# Altium footprint library con-samtec.PCBLIB: 805 footprints (part 44 of 55) (continued)
## TSW-136-02-S-Q-RA [mil]
pads (72):
  oct 59.06x59.06 hole 39.37: 1(1750,60) 2(1750,260) 3(1650,60) 4(1650,260) 5(1550,60) 6(1550,260) 7(1450,60) 8(1450,260) 9(1350,60) 10(1350,260) 11(1250,60) 12(1250,260) 13(1150,60) 14(1150,260) 15(1050,60) 16(1050,260) 17(950,60) 18(950,260) 19(850,60) 20(850,260) 21(750,60) 22(750,260) 23(650,60) 24(650,260) 25(550,60) 26(550,260) 27(450,60) 28(450,260) 29(350,60) 30(350,260) 31(250,60) 32(250,260) 33(150,60) 34(150,260) 35(50,60) 36(50,260) 37(-50,60) 38(-50,260) 39(-150,60) 40(-150,260) 41(-250,60) 42(-250,260) 43(-350,60) 44(-350,260) 45(-450,60) 46(-450,260) 47(-550,60) 48(-550,260) 49(-650,60) 50(-650,260) 51(-750,60) 52(-750,260) 53(-850,60) 54(-850,260) 55(-950,60) 56(-950,260) 57(-1050,60) 58(-1050,260) 59(-1150,60) 60(-1150,260) 61(-1250,60) 62(-1250,260) 63(-1350,60) 64(-1350,260) 65(-1450,60) 66(-1450,260) 67(-1550,60) 68(-1550,260) 69(-1650,60) 70(-1650,260) 71(-1750,60) 72(-1750,260)
Top Overlay:
  rectangle: -1760,-310.63 -1740,-80.32
  rectangle: -1660,-310.63 -1640,-80.32
  rectangle: -1560,-310.63 -1540,-80.32
  rectangle: -1460,-310.63 -1440,-80.32
  rectangle: -1360,-310.63 -1340,-80.32
  rectangle: -1260,-310.63 -1240,-80.32
  rectangle: -1160,-310.63 -1140,-80.32
  rectangle: -1060,-310.63 -1040,-80.32
  rectangle: -960,-310.63 -940,-80.32
  rectangle: -860,-310.63 -840,-80.32
  rectangle: -760,-310.63 -740,-80.32
  rectangle: -660,-310.63 -640,-80.32
  rectangle: -560,-310.63 -540,-80.32
  rectangle: -460,-310.63 -440,-80.32
  rectangle: -360,-310.63 -340,-80.32
  rectangle: -260,-310.63 -240,-80.32
  rectangle: -160,-310.63 -140,-80.32
  rectangle: -60,-310.63 -40,-80.32
  rectangle: 40,-310.63 60,-80.32
  rectangle: 140,-310.63 160,-80.32
  rectangle: 240,-310.63 260,-80.32
  rectangle: 340,-310.63 360,-80.32
  rectangle: 440,-310.63 460,-80.32
  rectangle: 540,-310.63 560,-80.32
  rectangle: 640,-310.63 660,-80.32
  rectangle: 740,-310.63 760,-80.32
  rectangle: 840,-310.63 860,-80.32
  rectangle: 940,-310.63 960,-80.32
  rectangle: 1040,-310.63 1060,-80.32
  rectangle: 1140,-310.63 1160,-80.32
  rectangle: 1240,-310.63 1260,-80.32
  rectangle: 1340,-310.63 1360,-80.32
  rectangle: 1440,-310.63 1460,-80.32
  rectangle: 1540,-310.63 1560,-80.32
  rectangle: 1640,-310.63 1660,-80.32
  rectangle: 1740,-310.63 1760,-80.32
  lines w8: -1805.08,-80.55 1805.08,-80.55 1805.08,-4.17 -1805.08,-4.17 -1805.08,-80.55
  text "1" at 1803.54,43.31 h36.81
  text "2" at 1801.18,242.72 h36.81
Mechanical 16:
  rectangle: -1760,0 -1740,270
  rectangle: -1660,0 -1640,270
  rectangle: -1560,0 -1540,270
  rectangle: -1460,0 -1440,270
  rectangle: -1360,0 -1340,270
  rectangle: -1260,0 -1240,270
  rectangle: -1160,0 -1140,270
  rectangle: -1060,0 -1040,270
  rectangle: -960,0 -940,270
  rectangle: -860,0 -840,270
  rectangle: -760,0 -740,270
  rectangle: -660,0 -640,270
  rectangle: -560,0 -540,270
  rectangle: -460,0 -440,270
  rectangle: -360,0 -340,270
  rectangle: -260,0 -240,270
  rectangle: -160,0 -140,270
  rectangle: -60,0 -40,270
  rectangle: 40,0 60,270
  rectangle: 140,0 160,270
  rectangle: 240,0 260,270
  rectangle: 340,0 360,270
  rectangle: 440,0 460,270
  rectangle: 540,0 560,270
  rectangle: 640,0 660,270
  rectangle: 740,0 760,270
  rectangle: 840,0 860,270
  rectangle: 940,0 960,270
  rectangle: 1040,0 1060,270
  rectangle: 1140,0 1160,270
  rectangle: 1240,0 1260,270
  rectangle: 1340,0 1360,270
  rectangle: 1440,0 1460,270
  rectangle: 1540,0 1560,270
  rectangle: 1640,0 1660,270
  rectangle: 1740,0 1760,270

## TSW-136-02-S-S [mm]
pads (36):
  oct 1.5x1.5 hole 1: 1(44.45,0) 2(41.91,0) 3(39.37,0) 4(36.83,0) 5(34.29,0) 6(31.75,0) 7(29.21,0) 8(26.67,0) 9(24.13,0) 10(21.59,0) 11(19.05,0) 12(16.51,0) 13(13.97,0) 14(11.43,0) 15(8.89,0) 16(6.35,0) 17(3.81,0) 18(1.27,0) 19(-1.27,0) 20(-3.81,0) 21(-6.35,0) 22(-8.89,0) 23(-11.43,0) 24(-13.97,0) 25(-16.51,0) 26(-19.05,0) 27(-21.59,0) 28(-24.13,0) 29(-26.67,0) 30(-29.21,0) 31(-31.75,0) 32(-34.29,0) 33(-36.83,0) 34(-39.37,0) 35(-41.91,0) 36(-44.45,0)
Top Overlay:
  lines w0.203: -45.849,-1.155 45.849,-1.155 45.849,1.155 -45.849,1.155 -45.849,-1.155
  text "1" at 44.192,-2.498 h0.94
Mechanical 16:
  rectangle: -44.8,-0.35 -44.1,0.35
  rectangle: -42.26,-0.35 -41.56,0.35
  rectangle: -39.72,-0.35 -39.02,0.35
  rectangle: -37.18,-0.35 -36.48,0.35
  rectangle: -34.64,-0.35 -33.94,0.35
  rectangle: -32.1,-0.35 -31.4,0.35
  rectangle: -29.56,-0.35 -28.86,0.35
  rectangle: -27.02,-0.35 -26.32,0.35
  rectangle: -24.48,-0.35 -23.78,0.35
  rectangle: -21.94,-0.35 -21.24,0.35
  rectangle: -19.4,-0.35 -18.7,0.35
  rectangle: -16.86,-0.35 -16.16,0.35
  rectangle: -14.32,-0.35 -13.62,0.35
  rectangle: -11.78,-0.35 -11.08,0.35
  rectangle: -9.24,-0.35 -8.54,0.35
  rectangle: -6.7,-0.35 -6,0.35
  rectangle: -4.16,-0.35 -3.46,0.35
  rectangle: -1.62,-0.35 -0.92,0.35
  rectangle: 0.92,-0.35 1.62,0.35
  rectangle: 3.46,-0.35 4.16,0.35
  rectangle: 6,-0.35 6.7,0.35
  rectangle: 8.54,-0.35 9.24,0.35
  rectangle: 11.08,-0.35 11.78,0.35
  rectangle: 13.62,-0.35 14.32,0.35
  rectangle: 16.16,-0.35 16.86,0.35
  rectangle: 18.7,-0.35 19.4,0.35
  rectangle: 21.24,-0.35 21.94,0.35
  rectangle: 23.78,-0.35 24.48,0.35
  rectangle: 26.32,-0.35 27.02,0.35
  rectangle: 28.86,-0.35 29.56,0.35
  rectangle: 31.4,-0.35 32.1,0.35
  rectangle: 33.94,-0.35 34.64,0.35
  rectangle: 36.48,-0.35 37.18,0.35
  rectangle: 39.02,-0.35 39.72,0.35
  rectangle: 41.56,-0.35 42.26,0.35
  rectangle: 44.1,-0.35 44.8,0.35

## TSW-136-02-S-S-RA [mil]
pads (36):
  oct 59.06x59.06 hole 39.37: 1(1750,60) 2(1650,60) 3(1550,60) 4(1450,60) 5(1350,60) 6(1250,60) 7(1150,60) 8(1050,60) 9(950,60) 10(850,60) 11(750,60) 12(650,60) 13(550,60) 14(450,60) 15(350,60) 16(250,60) 17(150,60) 18(50,60) 19(-50,60) 20(-150,60) 21(-250,60) 22(-350,60) 23(-450,60) 24(-550,60) 25(-650,60) 26(-750,60) 27(-850,60) 28(-950,60) 29(-1050,60) 30(-1150,60) 31(-1250,60) 32(-1350,60) 33(-1450,60) 34(-1550,60) 35(-1650,60) 36(-1750,60)
Top Overlay:
  rectangle: -1760,-310.63 -1740,-80.32
  rectangle: -1660,-310.63 -1640,-80.32
  rectangle: -1560,-310.63 -1540,-80.32
  rectangle: -1460,-310.63 -1440,-80.32
  rectangle: -1360,-310.63 -1340,-80.32
  rectangle: -1260,-310.63 -1240,-80.32
  rectangle: -1160,-310.63 -1140,-80.32
  rectangle: -1060,-310.63 -1040,-80.32
  rectangle: -960,-310.63 -940,-80.32
  rectangle: -860,-310.63 -840,-80.32
  rectangle: -760,-310.63 -740,-80.32
  rectangle: -660,-310.63 -640,-80.32
  rectangle: -560,-310.63 -540,-80.32
  rectangle: -460,-310.63 -440,-80.32
  rectangle: -360,-310.63 -340,-80.32
  rectangle: -260,-310.63 -240,-80.32
  rectangle: -160,-310.63 -140,-80.32
  rectangle: -60,-310.63 -40,-80.32
  rectangle: 40,-310.63 60,-80.32
  rectangle: 140,-310.63 160,-80.32
  rectangle: 240,-310.63 260,-80.32
  rectangle: 340,-310.63 360,-80.32
  rectangle: 440,-310.63 460,-80.32
  rectangle: 540,-310.63 560,-80.32
  rectangle: 640,-310.63 660,-80.32
  rectangle: 740,-310.63 760,-80.32
  rectangle: 840,-310.63 860,-80.32
  rectangle: 940,-310.63 960,-80.32
  rectangle: 1040,-310.63 1060,-80.32
  rectangle: 1140,-310.63 1160,-80.32
  rectangle: 1240,-310.63 1260,-80.32
  rectangle: 1340,-310.63 1360,-80.32
  rectangle: 1440,-310.63 1460,-80.32
  rectangle: 1540,-310.63 1560,-80.32
  rectangle: 1640,-310.63 1660,-80.32
  rectangle: 1740,-310.63 1760,-80.32
  lines w8: -1805.08,-80.55 1805.08,-80.55 1805.08,-4.17 -1805.08,-4.17 -1805.08,-80.55
  text "1" at 1800.47,45.35 h36.81
Mechanical 16:
  rectangle: -1760,0 -1740,70
  rectangle: -1660,0 -1640,70
  rectangle: -1560,0 -1540,70
  rectangle: -1460,0 -1440,70
  rectangle: -1360,0 -1340,70
  rectangle: -1260,0 -1240,70
  rectangle: -1160,0 -1140,70
  rectangle: -1060,0 -1040,70
  rectangle: -960,0 -940,70
  rectangle: -860,0 -840,70
  rectangle: -760,0 -740,70
  rectangle: -660,0 -640,70
  rectangle: -560,0 -540,70
  rectangle: -460,0 -440,70
  rectangle: -360,0 -340,70
  rectangle: -260,0 -240,70
  rectangle: -160,0 -140,70
  rectangle: -60,0 -40,70
  rectangle: 40,0 60,70
  rectangle: 140,0 160,70
  rectangle: 240,0 260,70
  rectangle: 340,0 360,70
  rectangle: 440,0 460,70
  rectangle: 540,0 560,70
  rectangle: 640,0 660,70
  rectangle: 740,0 760,70
  rectangle: 840,0 860,70
  rectangle: 940,0 960,70
  rectangle: 1040,0 1060,70
  rectangle: 1140,0 1160,70
  rectangle: 1240,0 1260,70
  rectangle: 1340,0 1360,70
  rectangle: 1440,0 1460,70
  rectangle: 1540,0 1560,70
  rectangle: 1640,0 1660,70
  rectangle: 1740,0 1760,70

## TSW-136-02-S-T [mm]
pads (108):
  oct 1.5x1.5 hole 1: 1(44.45,-2.54) 2(44.45,0) 3(44.45,2.54) 4(41.91,-2.54) 5(41.91,0) 6(41.91,2.54) 7(39.37,-2.54) 8(39.37,0) 9(39.37,2.54) 10(36.83,-2.54) 11(36.83,0) 12(36.83,2.54) 13(34.29,-2.54) 14(34.29,0) 15(34.29,2.54) 16(31.75,-2.54) 17(31.75,0) 18(31.75,2.54) 19(29.21,-2.54) 20(29.21,0) 21(29.21,2.54) 22(26.67,-2.54) 23(26.67,0) 24(26.67,2.54) 25(24.13,-2.54) 26(24.13,0) 27(24.13,2.54) 28(21.59,-2.54) 29(21.59,0) 30(21.59,2.54) 31(19.05,-2.54) 32(19.05,0) 33(19.05,2.54) 34(16.51,-2.54) 35(16.51,0) 36(16.51,2.54) 37(13.97,-2.54) 38(13.97,0) 39(13.97,2.54) 40(11.43,-2.54) 41(11.43,0) 42(11.43,2.54) 43(8.89,-2.54) 44(8.89,0) 45(8.89,2.54) 46(6.35,-2.54) 47(6.35,0) 48(6.35,2.54) 49(3.81,-2.54) 50(3.81,0) 51(3.81,2.54) 52(1.27,-2.54) 53(1.27,0) 54(1.27,2.54) 55(-1.27,-2.54) 56(-1.27,0) 57(-1.27,2.54) 58(-3.81,-2.54) 59(-3.81,0) 60(-3.81,2.54) 61(-6.35,-2.54) 62(-6.35,0) 63(-6.35,2.54) 64(-8.89,-2.54) 65(-8.89,0) 66(-8.89,2.54) 67(-11.43,-2.54) 68(-11.43,0) 69(-11.43,2.54) 70(-13.97,-2.54) 71(-13.97,0) 72(-13.97,2.54) 73(-16.51,-2.54) 74(-16.51,0) 75(-16.51,2.54) 76(-19.05,-2.54) 77(-19.05,0) 78(-19.05,2.54) 79(-21.59,-2.54) 80(-21.59,0) 81(-21.59,2.54) 82(-24.13,-2.54) 83(-24.13,0) 84(-24.13,2.54) 85(-26.67,-2.54) 86(-26.67,0) 87(-26.67,2.54) 88(-29.21,-2.54) 89(-29.21,0) 90(-29.21,2.54) 91(-31.75,-2.54) 92(-31.75,0) 93(-31.75,2.54) 94(-34.29,-2.54) 95(-34.29,0) 96(-34.29,2.54) 97(-36.83,-2.54) 98(-36.83,0) 99(-36.83,2.54) 100(-39.37,-2.54) 101(-39.37,0) 102(-39.37,2.54) 103(-41.91,-2.54) 104(-41.91,0) 105(-41.91,2.54) 106(-44.45,-2.54) 107(-44.45,0) 108(-44.45,2.54)
Top Overlay:
  lines w0.203: -45.849,-3.695 45.849,-3.695 45.849,3.695 -45.849,3.695 -45.849,-3.695
  text "1" at 44.142,-5.188 h0.94
  text "3" at 44.138,3.989 h0.94
Mechanical 16:
  rectangle: -44.8,-2.89 -44.1,-2.19
  rectangle: -44.8,-0.35 -44.1,0.35
  rectangle: -44.8,2.19 -44.1,2.89
  rectangle: -42.26,-2.89 -41.56,-2.19
  rectangle: -42.26,-0.35 -41.56,0.35
  rectangle: -42.26,2.19 -41.56,2.89
  rectangle: -39.72,-2.89 -39.02,-2.19
  rectangle: -39.72,-0.35 -39.02,0.35
  rectangle: -39.72,2.19 -39.02,2.89
  rectangle: -37.18,-2.89 -36.48,-2.19
  rectangle: -37.18,-0.35 -36.48,0.35
  rectangle: -37.18,2.19 -36.48,2.89
  rectangle: -34.64,-2.89 -33.94,-2.19
  rectangle: -34.64,-0.35 -33.94,0.35
  rectangle: -34.64,2.19 -33.94,2.89
  rectangle: -32.1,-2.89 -31.4,-2.19
  rectangle: -32.1,-0.35 -31.4,0.35
  rectangle: -32.1,2.19 -31.4,2.89
  rectangle: -29.56,-2.89 -28.86,-2.19
  rectangle: -29.56,-0.35 -28.86,0.35
  rectangle: -29.56,2.19 -28.86,2.89
  rectangle: -27.02,-2.89 -26.32,-2.19
  rectangle: -27.02,-0.35 -26.32,0.35
  rectangle: -27.02,2.19 -26.32,2.89
  rectangle: -24.48,-2.89 -23.78,-2.19
  rectangle: -24.48,-0.35 -23.78,0.35
  rectangle: -24.48,2.19 -23.78,2.89
  rectangle: -21.94,-2.89 -21.24,-2.19
  rectangle: -21.94,-0.35 -21.24,0.35
  rectangle: -21.94,2.19 -21.24,2.89
  rectangle: -19.4,-2.89 -18.7,-2.19
  rectangle: -19.4,-0.35 -18.7,0.35
  rectangle: -19.4,2.19 -18.7,2.89
  rectangle: -16.86,-2.89 -16.16,-2.19
  rectangle: -16.86,-0.35 -16.16,0.35
  rectangle: -16.86,2.19 -16.16,2.89
  rectangle: -14.32,-2.89 -13.62,-2.19
  rectangle: -14.32,-0.35 -13.62,0.35
  rectangle: -14.32,2.19 -13.62,2.89
  rectangle: -11.78,-2.89 -11.08,-2.19
  rectangle: -11.78,-0.35 -11.08,0.35
  rectangle: -11.78,2.19 -11.08,2.89
  rectangle: -9.24,-2.89 -8.54,-2.19
  rectangle: -9.24,-0.35 -8.54,0.35
  rectangle: -9.24,2.19 -8.54,2.89
  rectangle: -6.7,-2.89 -6,-2.19
  rectangle: -6.7,-0.35 -6,0.35
  rectangle: -6.7,2.19 -6,2.89
  rectangle: -4.16,-2.89 -3.46,-2.19
  rectangle: -4.16,-0.35 -3.46,0.35
  rectangle: -4.16,2.19 -3.46,2.89
  rectangle: -1.62,-2.89 -0.92,-2.19
  rectangle: -1.62,-0.35 -0.92,0.35
  rectangle: -1.62,2.19 -0.92,2.89
  rectangle: 0.92,-2.89 1.62,-2.19
  rectangle: 0.92,-0.35 1.62,0.35
  rectangle: 0.92,2.19 1.62,2.89
  rectangle: 3.46,-2.89 4.16,-2.19
  rectangle: 3.46,-0.35 4.16,0.35
  rectangle: 3.46,2.19 4.16,2.89
  rectangle: 6,-2.89 6.7,-2.19
  rectangle: 6,-0.35 6.7,0.35
  rectangle: 6,2.19 6.7,2.89
  rectangle: 8.54,-2.89 9.24,-2.19
  rectangle: 8.54,-0.35 9.24,0.35
  rectangle: 8.54,2.19 9.24,2.89
  rectangle: 11.08,-2.89 11.78,-2.19
  rectangle: 11.08,-0.35 11.78,0.35
  rectangle: 11.08,2.19 11.78,2.89
  rectangle: 13.62,-2.89 14.32,-2.19
  rectangle: 13.62,-0.35 14.32,0.35
  rectangle: 13.62,2.19 14.32,2.89
  rectangle: 16.16,-2.89 16.86,-2.19
  rectangle: 16.16,-0.35 16.86,0.35
  rectangle: 16.16,2.19 16.86,2.89
  rectangle: 18.7,-2.89 19.4,-2.19
  rectangle: 18.7,-0.35 19.4,0.35
  rectangle: 18.7,2.19 19.4,2.89
  rectangle: 21.24,-2.89 21.94,-2.19
  rectangle: 21.24,-0.35 21.94,0.35
  rectangle: 21.24,2.19 21.94,2.89
  rectangle: 23.78,-2.89 24.48,-2.19
  rectangle: 23.78,-0.35 24.48,0.35
  rectangle: 23.78,2.19 24.48,2.89
  rectangle: 26.32,-2.89 27.02,-2.19
  rectangle: 26.32,-0.35 27.02,0.35
  rectangle: 26.32,2.19 27.02,2.89
  rectangle: 28.86,-2.89 29.56,-2.19
  rectangle: 28.86,-0.35 29.56,0.35
  rectangle: 28.86,2.19 29.56,2.89
  rectangle: 31.4,-2.89 32.1,-2.19
  rectangle: 31.4,-0.35 32.1,0.35
  rectangle: 31.4,2.19 32.1,2.89
  rectangle: 33.94,-2.89 34.64,-2.19
  rectangle: 33.94,-0.35 34.64,0.35
  rectangle: 33.94,2.19 34.64,2.89
  rectangle: 36.48,-2.89 37.18,-2.19
  rectangle: 36.48,-0.35 37.18,0.35
  rectangle: 36.48,2.19 37.18,2.89
  rectangle: 39.02,-2.89 39.72,-2.19
  rectangle: 39.02,-0.35 39.72,0.35
  rectangle: 39.02,2.19 39.72,2.89
  rectangle: 41.56,-2.89 42.26,-2.19
  rectangle: 41.56,-0.35 42.26,0.35
  rectangle: 41.56,2.19 42.26,2.89
  rectangle: 44.1,-2.89 44.8,-2.19
  rectangle: 44.1,-0.35 44.8,0.35
  rectangle: 44.1,2.19 44.8,2.89

## TSW-136-02-S-T-RA [mil]
pads (105):
  oct 59.06x59.06 hole 39.37: 1(1650,60) 2(1650,160) 3(1650,260) 4(1550,60) 5(1550,160) 6(1550,260) 7(1450,60) 8(1450,160) 9(1450,260) 10(1350,60) 11(1350,160) 12(1350,260) 13(1250,60) 14(1250,160) 15(1250,260) 16(1150,60) 17(1150,160) 18(1150,260) 19(1050,60) 20(1050,160) 21(1050,260) 22(950,60) 23(950,160) 24(950,260) 25(850,60) 26(850,160) 27(850,260) 28(750,60) 29(750,160) 30(750,260) 31(650,60) 32(650,160) 33(650,260) 34(550,60) 35(550,160) 36(550,260) 37(450,60) 38(450,160) 39(450,260) 40(350,60) 41(350,160) 42(350,260) 43(250,60) 44(250,160) 45(250,260) 46(150,60) 47(150,160) 48(150,260) 49(50,60) 50(50,160) 51(50,260) 52(-50,60) 53(-50,160) 54(-50,260) 55(-150,60) 56(-150,160) 57(-150,260) 58(-250,60) 59(-250,160) 60(-250,260) 61(-350,60) 62(-350,160) 63(-350,260) 64(-450,60) 65(-450,160) 66(-450,260) 67(-550,60) 68(-550,160) 69(-550,260) 70(-650,60) 71(-650,160) 72(-650,260) 73(-750,60) 74(-750,160) 75(-750,260) 76(-850,60) 77(-850,160) 78(-850,260) 79(-950,60) 80(-950,160) 81(-950,260) 82(-1050,60) 83(-1050,160) 84(-1050,260) 85(-1150,60) 86(-1150,160) 87(-1150,260) 88(-1250,60) 89(-1250,160) 90(-1250,260) 91(-1350,60) 92(-1350,160) 93(-1350,260) 94(-1450,60) 95(-1450,160) 96(-1450,260) 97(-1550,60) 98(-1550,160) 99(-1550,260) 100(-1650,60) 101(-1650,160) 102(-1650,260) 103(-1750,60) 104(-1750,160) 105(-1750,260)
Top Overlay:
  rectangle: -1760,-310.63 -1740,-80.32
  rectangle: -1660,-310.63 -1640,-80.32
  rectangle: -1560,-310.63 -1540,-80.32
  rectangle: -1460,-310.63 -1440,-80.32
  rectangle: -1360,-310.63 -1340,-80.32
  rectangle: -1260,-310.63 -1240,-80.32
  rectangle: -1160,-310.63 -1140,-80.32
  rectangle: -1060,-310.63 -1040,-80.32
  rectangle: -960,-310.63 -940,-80.32
  rectangle: -860,-310.63 -840,-80.32
  rectangle: -760,-310.63 -740,-80.32
  rectangle: -660,-310.63 -640,-80.32
  rectangle: -560,-310.63 -540,-80.32
  rectangle: -460,-310.63 -440,-80.32
  rectangle: -360,-310.63 -340,-80.32
  rectangle: -260,-310.63 -240,-80.32
  rectangle: -160,-310.63 -140,-80.32
  rectangle: -60,-310.63 -40,-80.32
  rectangle: 40,-310.63 60,-80.32
  rectangle: 140,-310.63 160,-80.32
  rectangle: 240,-310.63 260,-80.32
  rectangle: 340,-310.63 360,-80.32
  rectangle: 440,-310.63 460,-80.32
  rectangle: 540,-310.63 560,-80.32
  rectangle: 640,-310.63 660,-80.32
  rectangle: 740,-310.63 760,-80.32
  rectangle: 840,-310.63 860,-80.32
  rectangle: 940,-310.63 960,-80.32
  rectangle: 1040,-310.63 1060,-80.32
  rectangle: 1140,-310.63 1160,-80.32
  rectangle: 1240,-310.63 1260,-80.32
  rectangle: 1340,-310.63 1360,-80.32
  rectangle: 1440,-310.63 1460,-80.32
  rectangle: 1540,-310.63 1560,-80.32
  rectangle: 1640,-310.63 1660,-80.32
  lines w8: -1805.08,-80.55 1705.08,-80.55 1705.08,-4.17 -1805.08,-4.17 -1805.08,-80.55
  text "1" at 1701.57,41.34 h36.81
  text "3" at 1702.17,236.81 h36.81
Mechanical 16:
  rectangle: -1760,0 -1740,270
  rectangle: -1660,0 -1640,270
  rectangle: -1560,0 -1540,270
  rectangle: -1460,0 -1440,270
  rectangle: -1360,0 -1340,270
  rectangle: -1260,0 -1240,270
  rectangle: -1160,0 -1140,270
  rectangle: -1060,0 -1040,270
  rectangle: -960,0 -940,270
  rectangle: -860,0 -840,270
  rectangle: -760,0 -740,270
  rectangle: -660,0 -640,270
  rectangle: -560,0 -540,270
  rectangle: -460,0 -440,270
  rectangle: -360,0 -340,270
  rectangle: -260,0 -240,270
  rectangle: -160,0 -140,270
  rectangle: -60,0 -40,270
  rectangle: 40,0 60,270
  rectangle: 140,0 160,270
  rectangle: 240,0 260,270
  rectangle: 340,0 360,270
  rectangle: 440,0 460,270
  rectangle: 540,0 560,270
  rectangle: 640,0 660,270
  rectangle: 740,0 760,270
  rectangle: 840,0 860,270
  rectangle: 940,0 960,270
  rectangle: 1040,0 1060,270
  rectangle: 1140,0 1160,270
  rectangle: 1240,0 1260,270
  rectangle: 1340,0 1360,270
  rectangle: 1440,0 1460,270
  rectangle: 1540,0 1560,270
  rectangle: 1640,0 1660,270

## TSW-137-02-S-D [mm]
pads (74):
  oct 1.5x1.5 hole 1: 1(45.72,-1.27) 2(45.72,1.27) 3(43.18,-1.27) 4(43.18,1.27) 5(40.64,-1.27) 6(40.64,1.27) 7(38.1,-1.27) 8(38.1,1.27) 9(35.56,-1.27) 10(35.56,1.27) 11(33.02,-1.27) 12(33.02,1.27) 13(30.48,-1.27) 14(30.48,1.27) 15(27.94,-1.27) 16(27.94,1.27) 17(25.4,-1.27) 18(25.4,1.27) 19(22.86,-1.27) 20(22.86,1.27) 21(20.32,-1.27) 22(20.32,1.27) 23(17.78,-1.27) 24(17.78,1.27) 25(15.24,-1.27) 26(15.24,1.27) 27(12.7,-1.27) 28(12.7,1.27) 29(10.16,-1.27) 30(10.16,1.27) 31(7.62,-1.27) 32(7.62,1.27) 33(5.08,-1.27) 34(5.08,1.27) 35(2.54,-1.27) 36(2.54,1.27) 37(0,-1.27) 38(0,1.27) 39(-2.54,-1.27) 40(-2.54,1.27) 41(-5.08,-1.27) 42(-5.08,1.27) 43(-7.62,-1.27) 44(-7.62,1.27) 45(-10.16,-1.27) 46(-10.16,1.27) 47(-12.7,-1.27) 48(-12.7,1.27) 49(-15.24,-1.27) 50(-15.24,1.27) 51(-17.78,-1.27) 52(-17.78,1.27) 53(-20.32,-1.27) 54(-20.32,1.27) 55(-22.86,-1.27) 56(-22.86,1.27) 57(-25.4,-1.27) 58(-25.4,1.27) 59(-27.94,-1.27) 60(-27.94,1.27) 61(-30.48,-1.27) 62(-30.48,1.27) 63(-33.02,-1.27) 64(-33.02,1.27) 65(-35.56,-1.27) 66(-35.56,1.27) 67(-38.1,-1.27) 68(-38.1,1.27) 69(-40.64,-1.27) 70(-40.64,1.27) 71(-43.18,-1.27) 72(-43.18,1.27) 73(-45.72,-1.27) 74(-45.72,1.27)
Top Overlay:
  lines w0.203: -47.119,-2.425 47.119,-2.425 47.119,2.425 -47.119,2.425 -47.119,-2.425
  text "1" at 45.512,-3.818 h0.94
  text "2" at 45.337,2.744 h0.94
Mechanical 16:
  rectangle: -46.07,-1.62 -45.37,-0.92
  rectangle: -46.07,0.92 -45.37,1.62
  rectangle: -43.53,-1.62 -42.83,-0.92
  rectangle: -43.53,0.92 -42.83,1.62
  rectangle: -40.99,-1.62 -40.29,-0.92
  rectangle: -40.99,0.92 -40.29,1.62
  rectangle: -38.45,-1.62 -37.75,-0.92
  rectangle: -38.45,0.92 -37.75,1.62
  rectangle: -35.91,-1.62 -35.21,-0.92
  rectangle: -35.91,0.92 -35.21,1.62
  rectangle: -33.37,-1.62 -32.67,-0.92
  rectangle: -33.37,0.92 -32.67,1.62
  rectangle: -30.83,-1.62 -30.13,-0.92
  rectangle: -30.83,0.92 -30.13,1.62
  rectangle: -28.29,-1.62 -27.59,-0.92
  rectangle: -28.29,0.92 -27.59,1.62
  rectangle: -25.75,-1.62 -25.05,-0.92
  rectangle: -25.75,0.92 -25.05,1.62
  rectangle: -23.21,-1.62 -22.51,-0.92
  rectangle: -23.21,0.92 -22.51,1.62
  rectangle: -20.67,-1.62 -19.97,-0.92
  rectangle: -20.67,0.92 -19.97,1.62
  rectangle: -18.13,-1.62 -17.43,-0.92
  rectangle: -18.13,0.92 -17.43,1.62
  rectangle: -15.59,-1.62 -14.89,-0.92
  rectangle: -15.59,0.92 -14.89,1.62
  rectangle: -13.05,-1.62 -12.35,-0.92
  rectangle: -13.05,0.92 -12.35,1.62
  rectangle: -10.51,-1.62 -9.81,-0.92
  rectangle: -10.51,0.92 -9.81,1.62
  rectangle: -7.97,-1.62 -7.27,-0.92
  rectangle: -7.97,0.92 -7.27,1.62
  rectangle: -5.43,-1.62 -4.73,-0.92
  rectangle: -5.43,0.92 -4.73,1.62
  rectangle: -2.89,-1.62 -2.19,-0.92
  rectangle: -2.89,0.92 -2.19,1.62
  rectangle: -0.35,-1.62 0.35,-0.92
  rectangle: -0.35,0.92 0.35,1.62
  rectangle: 2.19,-1.62 2.89,-0.92
  rectangle: 2.19,0.92 2.89,1.62
  rectangle: 4.73,-1.62 5.43,-0.92
  rectangle: 4.73,0.92 5.43,1.62
  rectangle: 7.27,-1.62 7.97,-0.92
  rectangle: 7.27,0.92 7.97,1.62
  rectangle: 9.81,-1.62 10.51,-0.92
  rectangle: 9.81,0.92 10.51,1.62
  rectangle: 12.35,-1.62 13.05,-0.92
  rectangle: 12.35,0.92 13.05,1.62
  rectangle: 14.89,-1.62 15.59,-0.92
  rectangle: 14.89,0.92 15.59,1.62
  rectangle: 17.43,-1.62 18.13,-0.92
  rectangle: 17.43,0.92 18.13,1.62
  rectangle: 19.97,-1.62 20.67,-0.92
  rectangle: 19.97,0.92 20.67,1.62
  rectangle: 22.51,-1.62 23.21,-0.92
  rectangle: 22.51,0.92 23.21,1.62
  rectangle: 25.05,-1.62 25.75,-0.92
  rectangle: 25.05,0.92 25.75,1.62
  rectangle: 27.59,-1.62 28.29,-0.92
  rectangle: 27.59,0.92 28.29,1.62
  rectangle: 30.13,-1.62 30.83,-0.92
  rectangle: 30.13,0.92 30.83,1.62
  rectangle: 32.67,-1.62 33.37,-0.92
  rectangle: 32.67,0.92 33.37,1.62
  rectangle: 35.21,-1.62 35.91,-0.92
  rectangle: 35.21,0.92 35.91,1.62
  rectangle: 37.75,-1.62 38.45,-0.92
  rectangle: 37.75,0.92 38.45,1.62
  rectangle: 40.29,-1.62 40.99,-0.92
  rectangle: 40.29,0.92 40.99,1.62
  rectangle: 42.83,-1.62 43.53,-0.92
  rectangle: 42.83,0.92 43.53,1.62
  rectangle: 45.37,-1.62 46.07,-0.92
  rectangle: 45.37,0.92 46.07,1.62

## TSW-137-02-S-D-RA [mil]
pads (74):
  oct 59.06x59.06 hole 39.37: 1(1800,60) 2(1800,160) 3(1700,60) 4(1700,160) 5(1600,60) 6(1600,160) 7(1500,60) 8(1500,160) 9(1400,60) 10(1400,160) 11(1300,60) 12(1300,160) 13(1200,60) 14(1200,160) 15(1100,60) 16(1100,160) 17(1000,60) 18(1000,160) 19(900,60) 20(900,160) 21(800,60) 22(800,160) 23(700,60) 24(700,160) 25(600,60) 26(600,160) 27(500,60) 28(500,160) 29(400,60) 30(400,160) 31(300,60) 32(300,160) 33(200,60) 34(200,160) 35(100,60) 36(100,160) 37(0,60) 38(0,160) 39(-100,60) 40(-100,160) 41(-200,60) 42(-200,160) 43(-300,60) 44(-300,160) 45(-400,60) 46(-400,160) 47(-500,60) 48(-500,160) 49(-600,60) 50(-600,160) 51(-700,60) 52(-700,160) 53(-800,60) 54(-800,160) 55(-900,60) 56(-900,160) 57(-1000,60) 58(-1000,160) 59(-1100,60) 60(-1100,160) 61(-1200,60) 62(-1200,160) 63(-1300,60) 64(-1300,160) 65(-1400,60) 66(-1400,160) 67(-1500,60) 68(-1500,160) 69(-1600,60) 70(-1600,160) 71(-1700,60) 72(-1700,160) 73(-1800,60) 74(-1800,160)
Top Overlay:
  rectangle: -1810,-310.63 -1790,-80.32
  rectangle: -1710,-310.63 -1690,-80.32
  rectangle: -1610,-310.63 -1590,-80.32
  rectangle: -1510,-310.63 -1490,-80.32
  rectangle: -1410,-310.63 -1390,-80.32
  rectangle: -1310,-310.63 -1290,-80.32
  rectangle: -1210,-310.63 -1190,-80.32
  rectangle: -1110,-310.63 -1090,-80.32
  rectangle: -1010,-310.63 -990,-80.32
  rectangle: -910,-310.63 -890,-80.32
  rectangle: -810,-310.63 -790,-80.32
  rectangle: -710,-310.63 -690,-80.32
  rectangle: -610,-310.63 -590,-80.32
  rectangle: -510,-310.63 -490,-80.32
  rectangle: -410,-310.63 -390,-80.32
  rectangle: -310,-310.63 -290,-80.32
  rectangle: -210,-310.63 -190,-80.32
  rectangle: -110,-310.63 -90,-80.32
  rectangle: -10,-310.63 10,-80.32
  rectangle: 90,-310.63 110,-80.32
  rectangle: 190,-310.63 210,-80.32
  rectangle: 290,-310.63 310,-80.32
  rectangle: 390,-310.63 410,-80.32
  rectangle: 490,-310.63 510,-80.32
  rectangle: 590,-310.63 610,-80.32
  rectangle: 690,-310.63 710,-80.32
  rectangle: 790,-310.63 810,-80.32
  rectangle: 890,-310.63 910,-80.32
  rectangle: 990,-310.63 1010,-80.32
  rectangle: 1090,-310.63 1110,-80.32
  rectangle: 1190,-310.63 1210,-80.32
  rectangle: 1290,-310.63 1310,-80.32
  rectangle: 1390,-310.63 1410,-80.32
  rectangle: 1490,-310.63 1510,-80.32
  rectangle: 1590,-310.63 1610,-80.32
  rectangle: 1690,-310.63 1710,-80.32
  rectangle: 1790,-310.63 1810,-80.32
  lines w8: -1855.08,-80.55 1855.08,-80.55 1855.08,-4.17 -1855.08,-4.17 -1855.08,-80.55
  text "1" at 1850.59,30.51 h36.81
  text "2" at 1849.21,129.53 h36.81
Mechanical 16:
  rectangle: -1810,0 -1790,170
  rectangle: -1710,0 -1690,170
  rectangle: -1610,0 -1590,170
  rectangle: -1510,0 -1490,170
  rectangle: -1410,0 -1390,170
  rectangle: -1310,0 -1290,170
  rectangle: -1210,0 -1190,170
  rectangle: -1110,0 -1090,170
  rectangle: -1010,0 -990,170
  rectangle: -910,0 -890,170
  rectangle: -810,0 -790,170
  rectangle: -710,0 -690,170
  rectangle: -610,0 -590,170
  rectangle: -510,0 -490,170
  rectangle: -410,0 -390,170
  rectangle: -310,0 -290,170
  rectangle: -210,0 -190,170
  rectangle: -110,0 -90,170
  rectangle: -10,0 10,170
  rectangle: 90,0 110,170
  rectangle: 190,0 210,170
  rectangle: 290,0 310,170
  rectangle: 390,0 410,170
  rectangle: 490,0 510,170
  rectangle: 590,0 610,170
  rectangle: 690,0 710,170
  rectangle: 790,0 810,170
  rectangle: 890,0 910,170
  rectangle: 990,0 1010,170
  rectangle: 1090,0 1110,170
  rectangle: 1190,0 1210,170
  rectangle: 1290,0 1310,170
  rectangle: 1390,0 1410,170
  rectangle: 1490,0 1510,170
  rectangle: 1590,0 1610,170
  rectangle: 1690,0 1710,170
  rectangle: 1790,0 1810,170